# Altium footprint library LION.PcbLib: 90 footprints (part 13 of 13)
Each footprint in its own frame and in the unit in brackets; x right, y up, seen from the top. Pads: shape width x height; smd on the part's side, far side on the other; paste and mask are expansions set on the pad; w line width, h text height; cw(c..) or ccw(c..) is an arc to the next point about the centre after c.
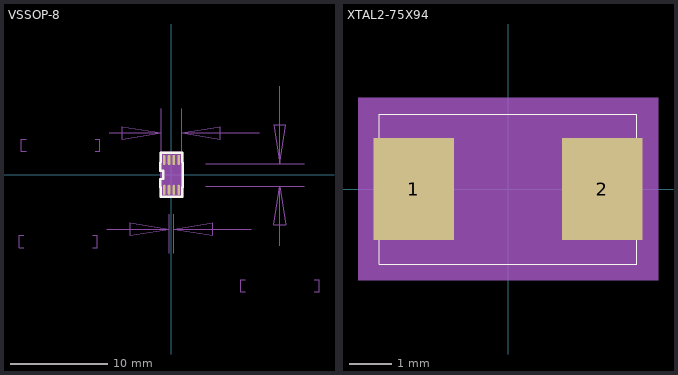
[diagram p12: the footprints below, top view; thin cyan lines are the x and y axes]

## VSSOP-8 [mil] "VSSOP-8"
pads (8):
  oval 11x41 smd: 1(-29.53,-60.61) 2(-9.84,-60.61) 3(9.84,-60.61) 4(29.53,-60.61) 5(29.53,60.61) 6(9.84,60.61) 7(-9.84,60.61) 8(-29.53,60.61)
Top Overlay:
  lines w10: -46.34,-50.28 -46.34,-16.76 -32.93,-16.76 -32.93,16.76 -46.34,16.76 -46.34,50.28 -43.03,50.28 -43.03,89.11 43.03,89.11 43.03,50.28 46.34,50.28 46.34,-50.28 43.03,-50.28 43.03,-89.11 -43.03,-89.11 -43.03,-50.28 -46.34,-50.28
Mechanical 5:
  lines w10: -46.34,-50.28 -43.03,-50.28 -43.03,-89.11 43.03,-89.11 43.03,-50.28 46.34,-50.28 46.34,50.28 43.03,50.28 43.03,89.11 -43.03,89.11 -43.03,50.28 -46.34,50.28 -46.34,16.76 -32.93,16.76 -32.93,-16.76 -46.34,-16.76 -46.34,-50.28
  text "U85" at -94.54,-38.68 h25
Mechanical 13:
  lines w1: -600,-295 -619,-295 -619,-245 -600,-245 ; -590,95 -609,95 -609,145 -590,145 ; -320,-295 -301,-295 -301,-245 -320,-245 ; -310,95 -291,95 -291,145 -310,145 ; -263.5,-220 -9.84,-220 ; -253.5,170 -41.34,170 ; -41.34,53.15 -41.34,268.43 ; -9.84,-318.43 -9.84,-159.04 ; 9.84,-318.43 9.84,-159.04 ; 41.34,53.15 41.34,268.43 ; 139.76,-45.28 538.43,-45.28 ; 139.76,45.28 538.43,45.28 ; 300,-475 281,-475 281,-425 300,-425 ; 324.8,-220 9.84,-220 ; 356.3,170 41.34,170 ; 440,-287.5 440,-45.28 ; 440,360.24 440,45.28 ; 580,-475 599,-475 599,-425 580,-425 ; -41.34,170 -198.82,145.39 -198.82,194.61 -41.34,170 ; -9.84,-220 -167.32,-244.61 -167.32,-195.39 -9.84,-220 ; 9.84,-220 167.32,-195.39 167.32,-244.61 9.84,-220 ; 41.34,170 198.82,194.61 198.82,145.39 41.34,170 ; 440,-45.28 464.61,-202.76 415.39,-202.76 440,-45.28 ; 440,45.28 415.39,202.76 464.61,202.76 440,45.28
  text "90.55" at 319,-475 h36
  text "2.3" at 370,-375 h36
  text "82.68" at -571,95 h36
  text "2.1" at -520,195 h36
  text "19.69" at -581,-295 h36
  text "0.5" at -530,-195 h36
Mechanical 14:
  text "2" at 1.36,-60.61 h28
  text "7" at 1.36,60.61 h28
  text "8" at -18.33,60.61 h28
  text "6" at 21.04,60.61 h28
  text "3" at 21.04,-60.61 h28
  text "5" at 40.73,60.61 h28
  text "4" at 40.73,-60.61 h28
  text "1" at -18.33,-60.61 h28
Mechanical 16:
  pour cut-out: 43.03,89.11 43.03,50.28 46.34,50.28 46.34,-50.28 43.03,-50.28 43.03,-89.11 -43.03,-89.11 -43.03,-50.28 -46.34,-50.28 -46.34,50.28 -43.03,50.28 -43.03,89.11
  region: -35.04,-61.03 -35.04,-45.28 -41.34,-45.28 -41.34,45.28 -35.04,45.28 -35.04,61.03 -24.02,61.03 -24.02,45.28 -15.35,45.28 -15.35,61.03 -4.33,61.03 -4.33,45.28 4.33,45.28 4.33,61.03 15.35,61.03 15.35,45.28 24.02,45.28 24.02,61.03 35.04,61.03 35.04,45.28 41.34,45.28 41.34,-45.28 35.04,-45.28 35.04,-61.03 24.02,-61.03 24.02,-45.28 15.35,-45.28 15.35,-61.03 4.33,-61.03 4.33,-45.28 -4.33,-45.28 -4.33,-61.03 -15.35,-61.03 -15.35,-45.28 -24.02,-45.28 -24.02,-61.03
  lines w1: -41.34,-45.28 -41.34,45.28 41.34,45.28 41.34,-45.28 -41.34,-45.28 ; -35.04,-61.03 -35.04,-50.03 -24.02,-50.03 -24.02,-61.03 -35.04,-61.03 ; -35.04,50.03 -35.04,61.03 -24.02,61.03 -24.02,50.03 -35.04,50.03 ; -15.35,-61.03 -15.35,-50.03 -4.33,-50.03 -4.33,-61.03 -15.35,-61.03 ; -15.35,50.03 -15.35,61.03 -4.33,61.03 -4.33,50.03 -15.35,50.03 ; 4.33,-61.03 4.33,-50.03 15.35,-50.03 15.35,-61.03 4.33,-61.03 ; 4.33,50.03 4.33,61.03 15.35,61.03 15.35,50.03 4.33,50.03 ; 24.02,-61.03 24.02,-50.03 35.04,-50.03 35.04,-61.03 24.02,-61.03 ; 24.02,50.03 24.02,61.03 35.04,61.03 35.04,50.03 24.02,50.03
Mechanical 17:
  text ".Designator" at 43.2,0 h36
3D body: height 150, standoff 0, extent -41.34,-61.03 41.34,61.03

## XTAL2-75X94 [mil] "XTAL2-75X94"
pads (2):
  rect 75x95 smd: 1(-88,0) 2(88,0)
Top Overlay:
  lines w1: -120,-70 -120,70 120,70 120,-70 -120,-70
Mechanical 5:
  lines w1: -120,-47.5 -120,-70 120,-70 120,-47.5 ; -120,47.5 -120,70 120,70 120,47.5
  text "Y2" at -39.79,147.68 h25
Mechanical 14:
  text "2" at 88,16 h40
  text "1" at -88,16 h40
Mechanical 16:
  region: -140,-85 -140,85 140,85 140,-85
  lines w1: -120,-70 -120,70 120,70 120,-70 -120,-70
Mechanical 17:
  text ".Designator" at -40,-11.67 h35
3D body: height 150, standoff 0, extent -140,-85 140,85